# Altium schematic symbol library MCU_Microchip_ATmega.SchLib: 440 symbols (part 1 of 9) (continued)
## ATmega32A-M (continued)

## ATmega32A-P
designator *  value ATmega32A-P
ki_keywords: AVR 8bit Microcontroller MegaAVR; ki_description: 16MHz, 32kB Flash, 2kB SRAM, 1kB EEPROM, JTAG, DIP-40; ki_fp_filters: DIP*W15.24mm*; Footprint: Package_DIP:DIP-40_W15.24mm; Supplier: http://ww1.microchip.com/downloads/en/DeviceDoc/atmel-8155-8-bit-microcontroller-avr-atmega32a_datasheet.pdf
footprint DIP-40_W15.24mm
pins: 1 PB0 (io), 2 PB1 (io), 3 PB2 (io), 4 PB3 (io), 5 PB4 (io), 6 PB5 (io), 7 PB6 (io), 8 PB7 (io), 9 ~{{RESET}} (in), 10 VCC (power), 11 GND (power), 12 XTAL2 (out), 13 XTAL1 (in), 14 PD0 (io), 15 PD1 (io), 16 PD2 (io), 17 PD3 (io), 18 PD4 (io), 19 PD5 (io), 20 PD6 (io), 21 PD7 (io), 22 PC0 (io), 23 PC1 (io), 24 PC2 (io), 25 PC3 (io), 26 PC4 (io), 27 PC5 (io), 28 PC6 (io), 29 PC7 (io), 30 AVCC (power), 31 GND hidden, 32 AREF, 33 PA7 (io), 34 PA6 (io), 35 PA5 (io), 36 PA4 (io), 37 PA3 (io), 38 PA2 (io), 39 PA1 (io), 40 PA0 (io)

## ATmega32L-8A
designator *  value ATmega32L-8A
ki_keywords: AVR 8bit Microcontroller MegaAVR; ki_description: 8MHz, 32kB Flash, 2kB SRAM, 1kB EEPROM, JTAG, TQFP-44; ki_fp_filters: TQFP*10x10mm*P0.8mm*; Footprint: Package_QFP:TQFP-44_10x10mm_P0.8mm; Supplier: http://ww1.microchip.com/downloads/en/DeviceDoc/doc2503.pdf
footprint TQFP-44_10x10mm_P0.8mm
pins: 1 PB5 (io), 2 PB6 (io), 3 PB7 (io), 4 ~{{RESET}} (in), 5 VCC (power), 6 GND (power), 7 XTAL2 (out), 8 XTAL1 (in), 9 PD0 (io), 10 PD1 (io), 11 PD2 (io), 12 PD3 (io), 13 PD4 (io), 14 PD5 (io), 15 PD6 (io), 16 PD7 (io), 17 VCC hidden, 18 GND hidden, 19 PC0 (io), 20 PC1 (io), 21 PC2 (io), 22 PC3 (io), 23 PC4 (io), 24 PC5 (io), 25 PC6 (io), 26 PC7 (io), 27 AVCC (power), 28 GND hidden, 29 AREF, 30 PA7 (io), 31 PA6 (io), 32 PA5 (io), 33 PA4 (io), 34 PA3 (io), 35 PA2 (io), 36 PA1 (io), 37 PA0 (io), 38 VCC hidden, 39 GND hidden, 40 PB0 (io), 41 PB1 (io), 42 PB2 (io), 43 PB3 (io), 44 PB4 (io)

## ATmega32L-8M
designator *  value ATmega32L-8M
ki_keywords: AVR 8bit Microcontroller MegaAVR; ki_description: 8MHz, 32kB Flash, 2kB SRAM, 1kB EEPROM, JTAG, QFN-44; ki_fp_filters: QFN*1EP*7x7mm*P0.5mm*; Footprint: Package_DFN_QFN:QFN-44-1EP_7x7mm_P0.5mm_EP5.2x5.2mm; Supplier: http://ww1.microchip.com/downloads/en/DeviceDoc/doc2503.pdf
footprint QFN-44-1EP_7x7mm_P0.5mm_EP5.2x5.2mm
pins: 1 PB5 (io), 2 PB6 (io), 3 PB7 (io), 4 ~{{RESET}} (in), 5 VCC (power), 6 GND (power), 7 XTAL2 (out), 8 XTAL1 (in), 9 PD0 (io), 10 PD1 (io), 11 PD2 (io), 12 PD3 (io), 13 PD4 (io), 14 PD5 (io), 15 PD6 (io), 16 PD7 (io), 17 VCC hidden, 18 GND hidden, 19 PC0 (io), 20 PC1 (io), 21 PC2 (io), 22 PC3 (io), 23 PC4 (io), 24 PC5 (io), 25 PC6 (io), 26 PC7 (io), 27 AVCC (power), 28 GND hidden, 29 AREF, 30 PA7 (io), 31 PA6 (io), 32 PA5 (io), 33 PA4 (io), 34 PA3 (io), 35 PA2 (io), 36 PA1 (io), 37 PA0 (io), 38 VCC hidden, 39 GND hidden, 40 PB0 (io), 41 PB1 (io), 42 PB2 (io), 43 PB3 (io), 44 PB4 (io), 45 GND hidden

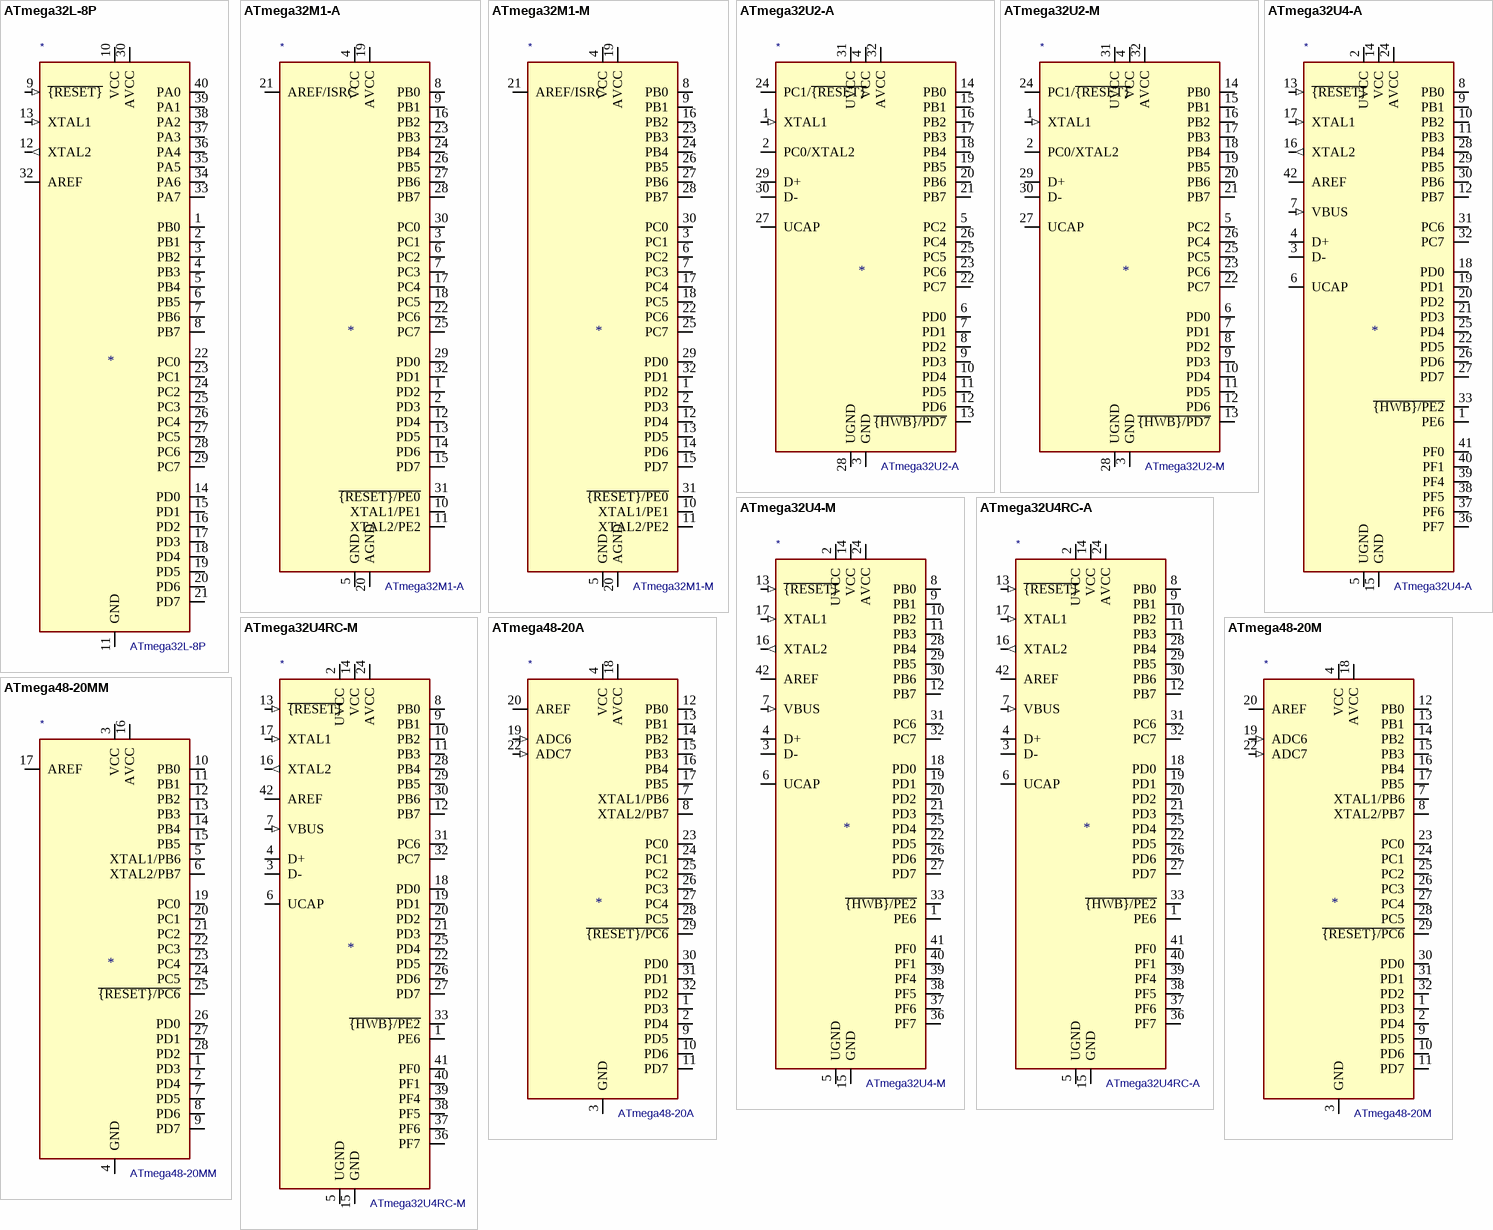
[diagram p3: symbols ATmega32L-8P to ATmega48-20MM]

## ATmega32L-8P
designator *  value ATmega32L-8P
ki_keywords: AVR 8bit Microcontroller MegaAVR; ki_description: 8MHz, 32kB Flash, 2kB SRAM, 1kB EEPROM, JTAG, DIP-40; ki_fp_filters: DIP*W15.24mm*; Footprint: Package_DIP:DIP-40_W15.24mm; Supplier: http://ww1.microchip.com/downloads/en/DeviceDoc/doc2503.pdf
footprint DIP-40_W15.24mm
pins: 1 PB0 (io), 2 PB1 (io), 3 PB2 (io), 4 PB3 (io), 5 PB4 (io), 6 PB5 (io), 7 PB6 (io), 8 PB7 (io), 9 ~{{RESET}} (in), 10 VCC (power), 11 GND (power), 12 XTAL2 (out), 13 XTAL1 (in), 14 PD0 (io), 15 PD1 (io), 16 PD2 (io), 17 PD3 (io), 18 PD4 (io), 19 PD5 (io), 20 PD6 (io), 21 PD7 (io), 22 PC0 (io), 23 PC1 (io), 24 PC2 (io), 25 PC3 (io), 26 PC4 (io), 27 PC5 (io), 28 PC6 (io), 29 PC7 (io), 30 AVCC (power), 31 GND hidden, 32 AREF, 33 PA7 (io), 34 PA6 (io), 35 PA5 (io), 36 PA4 (io), 37 PA3 (io), 38 PA2 (io), 39 PA1 (io), 40 PA0 (io)

## ATmega32M1-A
designator *  value ATmega32M1-A
ki_keywords: AVR 8bit Microcontroller MegaAVR; ki_description: 16MHz, 32kB Flash, 2kB SRAM, 1kB EEPROM, CAN, TQFP-32; ki_fp_filters: TQFP*7x7mm*P0.8mm*; Footprint: Package_QFP:TQFP-32_7x7mm_P0.8mm; Supplier: http://ww1.microchip.com/downloads/en/DeviceDoc/Atmel-8209-8-bit%20AVR%20ATmega16M1-32M1-64M1_Datasheet.pdf
footprint TQFP-32_7x7mm_P0.8mm
pins: 1 PD2 (io), 2 PD3 (io), 3 PC1 (io), 4 VCC (power), 5 GND (power), 6 PC2 (io), 7 PC3 (io), 8 PB0 (io), 9 PB1 (io), 10 XTAL1/PE1 (io), 11 XTAL2/PE2 (io), 12 PD4 (io), 13 PD5 (io), 14 PD6 (io), 15 PD7 (io), 16 PB2 (io), 17 PC4 (io), 18 PC5 (io), 19 AVCC (power), 20 AGND (power), 21 AREF/ISRC, 22 PC6 (io), 23 PB3 (io), 24 PB4 (io), 25 PC7 (io), 26 PB5 (io), 27 PB6 (io), 28 PB7 (io), 29 PD0 (io), 30 PC0 (io), 31 ~{{RESET}/PE0} (io), 32 PD1 (io)

## ATmega32M1-M
designator *  value ATmega32M1-M
ki_keywords: AVR 8bit Microcontroller MegaAVR; ki_description: 16MHz, 32kB Flash, 2kB SRAM, 1kB EEPROM, CAN, QFN-32; ki_fp_filters: QFN*1EP*7x7mm*P0.65mm*; Footprint: Package_DFN_QFN:QFN-32-1EP_7x7mm_P0.65mm_EP4.65x4.65mm; Supplier: http://ww1.microchip.com/downloads/en/DeviceDoc/Atmel-8209-8-bit%20AVR%20ATmega16M1-32M1-64M1_Datasheet.pdf
footprint QFN-32-1EP_7x7mm_P0.65mm_EP4.65x4.65mm
pins: 1 PD2 (io), 2 PD3 (io), 3 PC1 (io), 4 VCC (power), 5 GND (power), 6 PC2 (io), 7 PC3 (io), 8 PB0 (io), 9 PB1 (io), 10 XTAL1/PE1 (io), 11 XTAL2/PE2 (io), 12 PD4 (io), 13 PD5 (io), 14 PD6 (io), 15 PD7 (io), 16 PB2 (io), 17 PC4 (io), 18 PC5 (io), 19 AVCC (power), 20 AGND (power), 21 AREF/ISRC, 22 PC6 (io), 23 PB3 (io), 24 PB4 (io), 25 PC7 (io), 26 PB5 (io), 27 PB6 (io), 28 PB7 (io), 29 PD0 (io), 30 PC0 (io), 31 ~{{RESET}/PE0} (io), 32 PD1 (io), 33 GND hidden

## ATmega32U2-A
designator *  value ATmega32U2-A
ki_keywords: AVR 8bit Microcontroller MegaAVR; ki_description: 16MHz, 32kB Flash, 1kB SRAM, 1kB EEPROM, TQFP-32; ki_fp_filters: TQFP*7x7mm*P0.8mm*; Footprint: Package_QFP:TQFP-32_7x7mm_P0.8mm; Supplier: http://ww1.microchip.com/downloads/en/DeviceDoc/doc7799.pdf
footprint TQFP-32_7x7mm_P0.8mm
pins: 1 XTAL1 (in), 2 PC0/XTAL2 (io), 3 GND (power), 4 VCC (power), 5 PC2 (io), 6 PD0 (io), 7 PD1 (io), 8 PD2 (io), 9 PD3 (io), 10 PD4 (io), 11 PD5 (io), 12 PD6 (io), 13 ~{{HWB}/PD7} (io), 14 PB0 (io), 15 PB1 (io), 16 PB2 (io), 17 PB3 (io), 18 PB4 (io), 19 PB5 (io), 20 PB6 (io), 21 PB7 (io), 22 PC7 (io), 23 PC6 (io), 24 PC1/~{{RESET}} (io), 25 PC5 (io), 26 PC4 (io), 27 UCAP, 28 UGND (power), 29 D+ (io), 30 D- (io), 31 UVCC (power), 32 AVCC (power)

## ATmega32U2-M
designator *  value ATmega32U2-M
ki_keywords: AVR 8bit Microcontroller MegaAVR; ki_description: 16MHz, 32kB Flash, 1kB SRAM, 1kB EEPROM, QFN-32; ki_fp_filters: QFN*1EP*5x5mm*P0.5mm*; Footprint: Package_DFN_QFN:QFN-32-1EP_5x5mm_P0.5mm_EP3.1x3.1mm; Supplier: http://ww1.microchip.com/downloads/en/DeviceDoc/doc7799.pdf
footprint QFN-32-1EP_5x5mm_P0.5mm_EP3.1x3.1mm
pins: 1 XTAL1 (in), 2 PC0/XTAL2 (io), 3 GND (power), 4 VCC (power), 5 PC2 (io), 6 PD0 (io), 7 PD1 (io), 8 PD2 (io), 9 PD3 (io), 10 PD4 (io), 11 PD5 (io), 12 PD6 (io), 13 ~{{HWB}/PD7} (io), 14 PB0 (io), 15 PB1 (io), 16 PB2 (io), 17 PB3 (io), 18 PB4 (io), 19 PB5 (io), 20 PB6 (io), 21 PB7 (io), 22 PC7 (io), 23 PC6 (io), 24 PC1/~{{RESET}} (io), 25 PC5 (io), 26 PC4 (io), 27 UCAP, 28 UGND (power), 29 D+ (io), 30 D- (io), 31 UVCC (power), 32 AVCC (power), 33 GND hidden

## ATmega32U4-A
designator *  value ATmega32U4-A
ki_keywords: AVR 8bit Microcontroller MegaAVR USB; ki_description: 16MHz, 32kB Flash, 2.5kB SRAM, 1kB EEPROM, USB 2.0, TQFP-44; ki_fp_filters: TQFP*10x10mm*P0.8mm*; Footprint: Package_QFP:TQFP-44_10x10mm_P0.8mm; Supplier: http://ww1.microchip.com/downloads/en/DeviceDoc/Atmel-7766-8-bit-AVR-ATmega16U4-32U4_Datasheet.pdf
footprint TQFP-44_10x10mm_P0.8mm
pins: 1 PE6 (io), 2 UVCC (power), 3 D- (io), 4 D+ (io), 5 UGND, 6 UCAP, 7 VBUS (in), 8 PB0 (io), 9 PB1 (io), 10 PB2 (io), 11 PB3 (io), 12 PB7 (io), 13 ~{{RESET}} (in), 14 VCC (power), 15 GND (power), 16 XTAL2 (out), 17 XTAL1 (in), 18 PD0 (io), 19 PD1 (io), 20 PD2 (io), 21 PD3 (io), 22 PD5 (io), 23 GND hidden, 24 AVCC (power), 25 PD4 (io), 26 PD6 (io), 27 PD7 (io), 28 PB4 (io), 29 PB5 (io), 30 PB6 (io), 31 PC6 (io), 32 PC7 (io), 33 ~{{HWB}/PE2} (io), 34 VCC hidden, 35 GND hidden, 36 PF7 (io), 37 PF6 (io), 38 PF5 (io), 39 PF4 (io), 40 PF1 (io), 41 PF0 (io), 42 AREF, 43 GND hidden, 44 AVCC hidden

## ATmega32U4-M
designator *  value ATmega32U4-M
ki_keywords: AVR 8bit Microcontroller MegaAVR USB; ki_description: 16MHz, 32kB Flash, 2.5kB SRAM, 1kB EEPROM, USB 2.0, QFN-44; ki_fp_filters: QFN*1EP*7x7mm*P0.5mm*; Footprint: Package_DFN_QFN:QFN-44-1EP_7x7mm_P0.5mm_EP5.2x5.2mm; Supplier: http://ww1.microchip.com/downloads/en/DeviceDoc/Atmel-7766-8-bit-AVR-ATmega16U4-32U4_Datasheet.pdf
footprint QFN-44-1EP_7x7mm_P0.5mm_EP5.2x5.2mm
pins: 1 PE6 (io), 2 UVCC (power), 3 D- (io), 4 D+ (io), 5 UGND, 6 UCAP, 7 VBUS (in), 8 PB0 (io), 9 PB1 (io), 10 PB2 (io), 11 PB3 (io), 12 PB7 (io), 13 ~{{RESET}} (in), 14 VCC (power), 15 GND (power), 16 XTAL2 (out), 17 XTAL1 (in), 18 PD0 (io), 19 PD1 (io), 20 PD2 (io), 21 PD3 (io), 22 PD5 (io), 23 GND hidden, 24 AVCC (power), 25 PD4 (io), 26 PD6 (io), 27 PD7 (io), 28 PB4 (io), 29 PB5 (io), 30 PB6 (io), 31 PC6 (io), 32 PC7 (io), 33 ~{{HWB}/PE2} (io), 34 VCC hidden, 35 GND hidden, 36 PF7 (io), 37 PF6 (io), 38 PF5 (io), 39 PF4 (io), 40 PF1 (io), 41 PF0 (io), 42 AREF, 43 GND hidden, 44 AVCC hidden, 45 GND hidden

## ATmega32U4RC-A
designator *  value ATmega32U4RC-A
ki_keywords: AVR 8bit Microcontroller MegaAVR USB; ki_description: 16MHz, 32kB Flash, 2.5kB SRAM, 1kB EEPROM, USB 2.0, RC Osc, TQFP-44; ki_fp_filters: TQFP*10x10mm*P0.8mm*; Footprint: Package_QFP:TQFP-44_10x10mm_P0.8mm; Supplier: http://ww1.microchip.com/downloads/en/DeviceDoc/Atmel-7766-8-bit-AVR-ATmega16U4-32U4_Datasheet.pdf
footprint TQFP-44_10x10mm_P0.8mm
pins: 1 PE6 (io), 2 UVCC (power), 3 D- (io), 4 D+ (io), 5 UGND, 6 UCAP, 7 VBUS (in), 8 PB0 (io), 9 PB1 (io), 10 PB2 (io), 11 PB3 (io), 12 PB7 (io), 13 ~{{RESET}} (in), 14 VCC (power), 15 GND (power), 16 XTAL2 (out), 17 XTAL1 (in), 18 PD0 (io), 19 PD1 (io), 20 PD2 (io), 21 PD3 (io), 22 PD5 (io), 23 GND hidden, 24 AVCC (power), 25 PD4 (io), 26 PD6 (io), 27 PD7 (io), 28 PB4 (io), 29 PB5 (io), 30 PB6 (io), 31 PC6 (io), 32 PC7 (io), 33 ~{{HWB}/PE2} (io), 34 VCC hidden, 35 GND hidden, 36 PF7 (io), 37 PF6 (io), 38 PF5 (io), 39 PF4 (io), 40 PF1 (io), 41 PF0 (io), 42 AREF, 43 GND hidden, 44 AVCC hidden

## ATmega32U4RC-M
designator *  value ATmega32U4RC-M
ki_keywords: AVR 8bit Microcontroller MegaAVR USB; ki_description: 16MHz, 32kB Flash, 2.5kB SRAM, 1kB EEPROM, USB 2.0, RC Osc, QFN-44; ki_fp_filters: QFN*1EP*7x7mm*P0.5mm*; Footprint: Package_DFN_QFN:QFN-44-1EP_7x7mm_P0.5mm_EP5.2x5.2mm; Supplier: http://ww1.microchip.com/downloads/en/DeviceDoc/Atmel-7766-8-bit-AVR-ATmega16U4-32U4_Datasheet.pdf
footprint QFN-44-1EP_7x7mm_P0.5mm_EP5.2x5.2mm
pins: 1 PE6 (io), 2 UVCC (power), 3 D- (io), 4 D+ (io), 5 UGND, 6 UCAP, 7 VBUS (in), 8 PB0 (io), 9 PB1 (io), 10 PB2 (io), 11 PB3 (io), 12 PB7 (io), 13 ~{{RESET}} (in), 14 VCC (power), 15 GND (power), 16 XTAL2 (out), 17 XTAL1 (in), 18 PD0 (io), 19 PD1 (io), 20 PD2 (io), 21 PD3 (io), 22 PD5 (io), 23 GND hidden, 24 AVCC (power), 25 PD4 (io), 26 PD6 (io), 27 PD7 (io), 28 PB4 (io), 29 PB5 (io), 30 PB6 (io), 31 PC6 (io), 32 PC7 (io), 33 ~{{HWB}/PE2} (io), 34 VCC hidden, 35 GND hidden, 36 PF7 (io), 37 PF6 (io), 38 PF5 (io), 39 PF4 (io), 40 PF1 (io), 41 PF0 (io), 42 AREF, 43 GND hidden, 44 AVCC hidden, 45 GND hidden

## ATmega48-20A
designator *  value ATmega48-20A
ki_keywords: AVR 8bit Microcontroller MegaAVR; ki_description: 20MHz, 4kB Flash, 512B SRAM, 256B EEPROM, TQFP-32; ki_fp_filters: TQFP*7x7mm*P0.8mm*; Footprint: Package_QFP:TQFP-32_7x7mm_P0.8mm; Supplier: http://ww1.microchip.com/downloads/en/DeviceDoc/Atmel-2545-8-bit-AVR-Microcontroller-ATmega48-88-168_Datasheet.pdf
footprint TQFP-32_7x7mm_P0.8mm
pins: 1 PD3 (io), 2 PD4 (io), 3 GND (power), 4 VCC (power), 5 GND hidden, 6 VCC hidden, 7 XTAL1/PB6 (io), 8 XTAL2/PB7 (io), 9 PD5 (io), 10 PD6 (io), 11 PD7 (io), 12 PB0 (io), 13 PB1 (io), 14 PB2 (io), 15 PB3 (io), 16 PB4 (io), 17 PB5 (io), 18 AVCC (power), 19 ADC6 (in), 20 AREF, 21 GND hidden, 22 ADC7 (in), 23 PC0 (io), 24 PC1 (io), 25 PC2 (io), 26 PC3 (io), 27 PC4 (io), 28 PC5 (io), 29 ~{{RESET}/PC6} (io), 30 PD0 (io), 31 PD1 (io), 32 PD2 (io)

## ATmega48-20M
designator *  value ATmega48-20M
ki_keywords: AVR 8bit Microcontroller MegaAVR; ki_description: 20MHz, 4kB Flash, 512B SRAM, 256B EEPROM, QFN-32; ki_fp_filters: QFN*1EP*5x5mm*P0.5mm*; Footprint: Package_DFN_QFN:QFN-32-1EP_5x5mm_P0.5mm_EP3.1x3.1mm; Supplier: http://ww1.microchip.com/downloads/en/DeviceDoc/Atmel-2545-8-bit-AVR-Microcontroller-ATmega48-88-168_Datasheet.pdf
footprint QFN-32-1EP_5x5mm_P0.5mm_EP3.1x3.1mm
pins: 1 PD3 (io), 2 PD4 (io), 3 GND (power), 4 VCC (power), 5 GND hidden, 6 VCC hidden, 7 XTAL1/PB6 (io), 8 XTAL2/PB7 (io), 9 PD5 (io), 10 PD6 (io), 11 PD7 (io), 12 PB0 (io), 13 PB1 (io), 14 PB2 (io), 15 PB3 (io), 16 PB4 (io), 17 PB5 (io), 18 AVCC (power), 19 ADC6 (in), 20 AREF, 21 GND hidden, 22 ADC7 (in), 23 PC0 (io), 24 PC1 (io), 25 PC2 (io), 26 PC3 (io), 27 PC4 (io), 28 PC5 (io), 29 ~{{RESET}/PC6} (io), 30 PD0 (io), 31 PD1 (io), 32 PD2 (io), 33 GND hidden

## ATmega48-20MM
designator *  value ATmega48-20MM
ki_keywords: AVR 8bit Microcontroller MegaAVR; ki_description: 20MHz, 4kB Flash, 512B SRAM, 256B EEPROM, QFN-28; ki_fp_filters: QFN*1EP*4x4mm*P0.45mm*; Footprint: Package_DFN_QFN:QFN-28-1EP_4x4mm_P0.45mm_EP2.4x2.4mm; Supplier: http://ww1.microchip.com/downloads/en/DeviceDoc/Atmel-2545-8-bit-AVR-Microcontroller-ATmega48-88-168_Datasheet.pdf
footprint QFN-28-1EP_4x4mm_P0.45mm_EP2.4x2.4mm
pins: 1 PD3 (io), 2 PD4 (io), 3 VCC (power), 4 GND (power), 5 XTAL1/PB6 (io), 6 XTAL2/PB7 (io), 7 PD5 (io), 8 PD6 (io), 9 PD7 (io), 10 PB0 (io), 11 PB1 (io), 12 PB2 (io), 13 PB3 (io), 14 PB4 (io), 15 PB5 (io), 16 AVCC (power), 17 AREF, 18 GND hidden, 19 PC0 (io), 20 PC1 (io), 21 PC2 (io), 22 PC3 (io), 23 PC4 (io), 24 PC5 (io), 25 ~{{RESET}/PC6} (io), 26 PD0 (io), 27 PD1 (io), 28 PD2 (io), 29 GND hidden

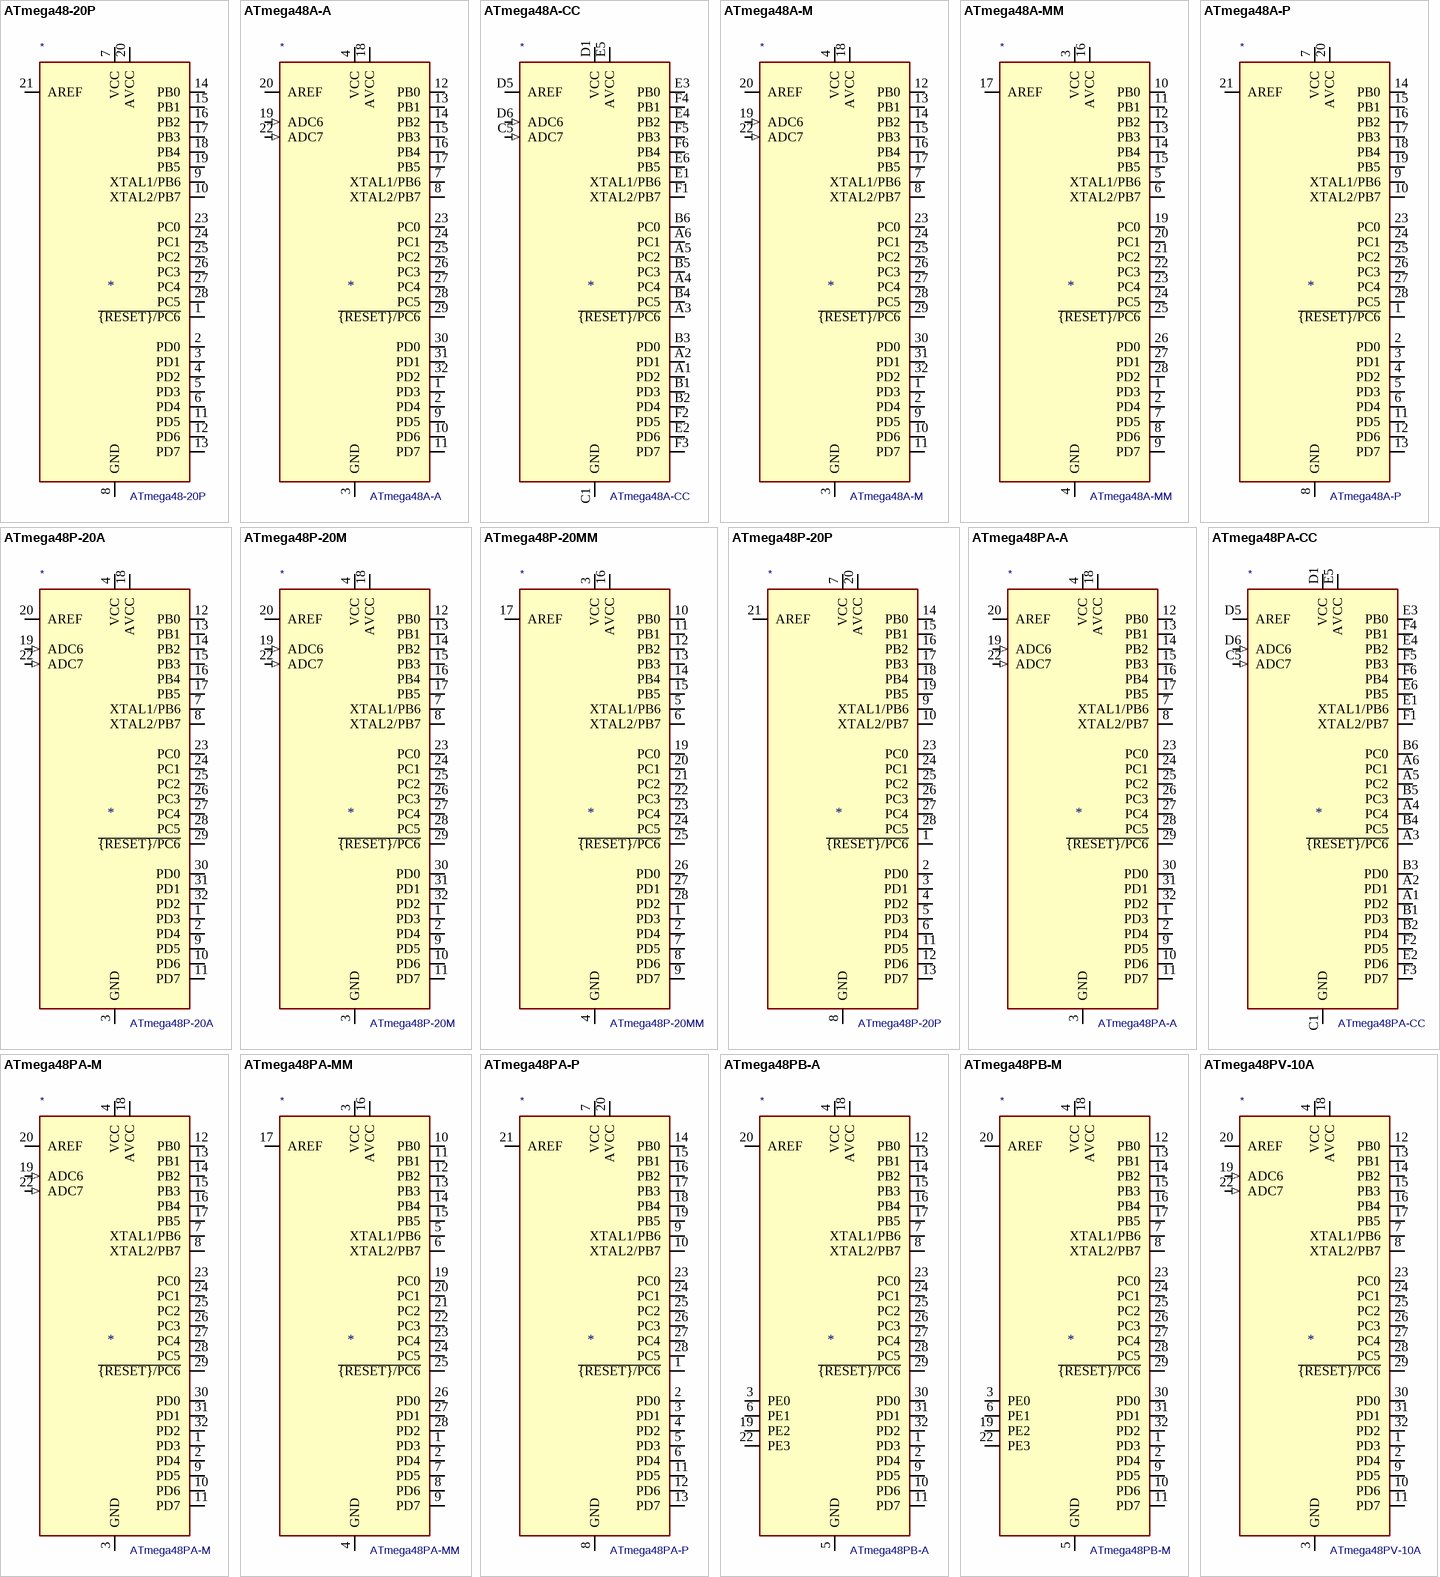
[diagram p4: symbols ATmega48-20P to ATmega48PV-10A]

## ATmega48-20P
designator *  value ATmega48-20P
ki_keywords: AVR 8bit Microcontroller MegaAVR; ki_description: 20MHz, 4kB Flash, 512B SRAM, 256B EEPROM, DIP-28; ki_fp_filters: DIP*W7.62mm*; Footprint: Package_DIP:DIP-28_W7.62mm; Supplier: http://ww1.microchip.com/downloads/en/DeviceDoc/Atmel-2545-8-bit-AVR-Microcontroller-ATmega48-88-168_Datasheet.pdf
footprint DIP-28_W7.62mm
pins: 1 ~{{RESET}/PC6} (io), 2 PD0 (io), 3 PD1 (io), 4 PD2 (io), 5 PD3 (io), 6 PD4 (io), 7 VCC (power), 8 GND (power), 9 XTAL1/PB6 (io), 10 XTAL2/PB7 (io), 11 PD5 (io), 12 PD6 (io), 13 PD7 (io), 14 PB0 (io), 15 PB1 (io), 16 PB2 (io), 17 PB3 (io), 18 PB4 (io), 19 PB5 (io), 20 AVCC (power), 21 AREF, 22 GND hidden, 23 PC0 (io), 24 PC1 (io), 25 PC2 (io), 26 PC3 (io), 27 PC4 (io), 28 PC5 (io)

## ATmega48A-A
designator *  value ATmega48A-A
ki_keywords: AVR 8bit Microcontroller MegaAVR; ki_description: 20MHz, 4kB Flash, 512B SRAM, 256B EEPROM, TQFP-32; ki_fp_filters: TQFP*7x7mm*P0.8mm*; Footprint: Package_QFP:TQFP-32_7x7mm_P0.8mm; Supplier: http://ww1.microchip.com/downloads/en/DeviceDoc/ATmega48A_88A_168A-Data-Sheet-40002007A.pdf
footprint TQFP-32_7x7mm_P0.8mm
pins: 1 PD3 (io), 2 PD4 (io), 3 GND (power), 4 VCC (power), 5 GND hidden, 6 VCC hidden, 7 XTAL1/PB6 (io), 8 XTAL2/PB7 (io), 9 PD5 (io), 10 PD6 (io), 11 PD7 (io), 12 PB0 (io), 13 PB1 (io), 14 PB2 (io), 15 PB3 (io), 16 PB4 (io), 17 PB5 (io), 18 AVCC (power), 19 ADC6 (in), 20 AREF, 21 GND hidden, 22 ADC7 (in), 23 PC0 (io), 24 PC1 (io), 25 PC2 (io), 26 PC3 (io), 27 PC4 (io), 28 PC5 (io), 29 ~{{RESET}/PC6} (io), 30 PD0 (io), 31 PD1 (io), 32 PD2 (io)

## ATmega48A-CC
designator *  value ATmega48A-CC
ki_keywords: AVR 8bit Microcontroller MegaAVR; ki_description: 20MHz, 4kB Flash, 512B SRAM, 256B EEPROM, UFBGA-32; ki_fp_filters: UFBGA*4.0x4.0mm*Layout6x6*P0.5mm*; Footprint: Package_BGA:UFBGA-32_4.0x4.0mm_Layout6x6_P0.5mm; Supplier: http://ww1.microchip.com/downloads/en/DeviceDoc/ATmega48A_88A_168A-Data-Sheet-40002007A.pdf
footprint UFBGA-32_4.0x4.0mm_Layout6x6_P0.5mm
pins: A1 PD2 (io), A2 PD1 (io), A3 ~{{RESET}/PC6} (io), A4 PC4 (io), A5 PC2 (io), A6 PC1 (io), B1 PD3 (io), B2 PD4 (io), B3 PD0 (io), B4 PC5 (io), B5 PC3 (io), B6 PC0 (io), C1 GND (power), C2 GND hidden, C5 ADC7 (in), C6 GND hidden, D1 VCC (power), D2 VCC hidden, D5 AREF, D6 ADC6 (in), E1 XTAL1/PB6 (io), E2 PD6 (io), E3 PB0 (io), E4 PB2 (io), E5 AVCC (power), E6 PB5 (io), F1 XTAL2/PB7 (io), F2 PD5 (io), F3 PD7 (io), F4 PB1 (io), F5 PB3 (io), F6 PB4 (io)

## ATmega48A-M
designator *  value ATmega48A-M
ki_keywords: AVR 8bit Microcontroller MegaAVR; ki_description: 20MHz, 4kB Flash, 512B SRAM, 256B EEPROM, QFN-32; ki_fp_filters: QFN*1EP*5x5mm*P0.5mm*; Footprint: Package_DFN_QFN:QFN-32-1EP_5x5mm_P0.5mm_EP3.1x3.1mm; Supplier: http://ww1.microchip.com/downloads/en/DeviceDoc/ATmega48A_88A_168A-Data-Sheet-40002007A.pdf
footprint QFN-32-1EP_5x5mm_P0.5mm_EP3.1x3.1mm
pins: 1 PD3 (io), 2 PD4 (io), 3 GND (power), 4 VCC (power), 5 GND hidden, 6 VCC hidden, 7 XTAL1/PB6 (io), 8 XTAL2/PB7 (io), 9 PD5 (io), 10 PD6 (io), 11 PD7 (io), 12 PB0 (io), 13 PB1 (io), 14 PB2 (io), 15 PB3 (io), 16 PB4 (io), 17 PB5 (io), 18 AVCC (power), 19 ADC6 (in), 20 AREF, 21 GND hidden, 22 ADC7 (in), 23 PC0 (io), 24 PC1 (io), 25 PC2 (io), 26 PC3 (io), 27 PC4 (io), 28 PC5 (io), 29 ~{{RESET}/PC6} (io), 30 PD0 (io), 31 PD1 (io), 32 PD2 (io), 33 GND hidden

## ATmega48A-MM
designator *  value ATmega48A-MM
ki_keywords: AVR 8bit Microcontroller MegaAVR; ki_description: 20MHz, 4kB Flash, 512B SRAM, 256B EEPROM, QFN-28; ki_fp_filters: QFN*1EP*4x4mm*P0.45mm*; Footprint: Package_DFN_QFN:QFN-28-1EP_4x4mm_P0.45mm_EP2.4x2.4mm; Supplier: http://ww1.microchip.com/downloads/en/DeviceDoc/ATmega48A_88A_168A-Data-Sheet-40002007A.pdf
footprint QFN-28-1EP_4x4mm_P0.45mm_EP2.4x2.4mm
pins: 1 PD3 (io), 2 PD4 (io), 3 VCC (power), 4 GND (power), 5 XTAL1/PB6 (io), 6 XTAL2/PB7 (io), 7 PD5 (io), 8 PD6 (io), 9 PD7 (io), 10 PB0 (io), 11 PB1 (io), 12 PB2 (io), 13 PB3 (io), 14 PB4 (io), 15 PB5 (io), 16 AVCC (power), 17 AREF, 18 GND hidden, 19 PC0 (io), 20 PC1 (io), 21 PC2 (io), 22 PC3 (io), 23 PC4 (io), 24 PC5 (io), 25 ~{{RESET}/PC6} (io), 26 PD0 (io), 27 PD1 (io), 28 PD2 (io), 29 GND hidden

## ATmega48A-P
designator *  value ATmega48A-P
ki_keywords: AVR 8bit Microcontroller MegaAVR; ki_description: 20MHz, 4kB Flash, 512B SRAM, 256B EEPROM, DIP-28; ki_fp_filters: DIP*W7.62mm*; Footprint: Package_DIP:DIP-28_W7.62mm; Supplier: http://ww1.microchip.com/downloads/en/DeviceDoc/ATmega48A_88A_168A-Data-Sheet-40002007A.pdf
footprint DIP-28_W7.62mm
pins: 1 ~{{RESET}/PC6} (io), 2 PD0 (io), 3 PD1 (io), 4 PD2 (io), 5 PD3 (io), 6 PD4 (io), 7 VCC (power), 8 GND (power), 9 XTAL1/PB6 (io), 10 XTAL2/PB7 (io), 11 PD5 (io), 12 PD6 (io), 13 PD7 (io), 14 PB0 (io), 15 PB1 (io), 16 PB2 (io), 17 PB3 (io), 18 PB4 (io), 19 PB5 (io), 20 AVCC (power), 21 AREF, 22 GND hidden, 23 PC0 (io), 24 PC1 (io), 25 PC2 (io), 26 PC3 (io), 27 PC4 (io), 28 PC5 (io)

## ATmega48P-20A
designator *  value ATmega48P-20A
ki_keywords: AVR 8bit Microcontroller MegaAVR; ki_description: 20MHz, 4kB Flash, 512B SRAM, 256B EEPROM, TQFP-32; ki_fp_filters: TQFP*7x7mm*P0.8mm*; Footprint: Package_QFP:TQFP-32_7x7mm_P0.8mm; Supplier: http://ww1.microchip.com/downloads/en/DeviceDoc/Atmel-8025-8-bit-AVR-Microcontroller-ATmega48P-88P-168P_Datasheet.pdf
footprint TQFP-32_7x7mm_P0.8mm
pins: 1 PD3 (io), 2 PD4 (io), 3 GND (power), 4 VCC (power), 5 GND hidden, 6 VCC hidden, 7 XTAL1/PB6 (io), 8 XTAL2/PB7 (io), 9 PD5 (io), 10 PD6 (io), 11 PD7 (io), 12 PB0 (io), 13 PB1 (io), 14 PB2 (io), 15 PB3 (io), 16 PB4 (io), 17 PB5 (io), 18 AVCC (power), 19 ADC6 (in), 20 AREF, 21 GND hidden, 22 ADC7 (in), 23 PC0 (io), 24 PC1 (io), 25 PC2 (io), 26 PC3 (io), 27 PC4 (io), 28 PC5 (io), 29 ~{{RESET}/PC6} (io), 30 PD0 (io), 31 PD1 (io), 32 PD2 (io)

## ATmega48P-20M
designator *  value ATmega48P-20M
ki_keywords: AVR 8bit Microcontroller MegaAVR; ki_description: 20MHz, 4kB Flash, 512B SRAM, 256B EEPROM, QFN-32; ki_fp_filters: QFN*1EP*5x5mm*P0.5mm*; Footprint: Package_DFN_QFN:QFN-32-1EP_5x5mm_P0.5mm_EP3.1x3.1mm; Supplier: http://ww1.microchip.com/downloads/en/DeviceDoc/Atmel-8025-8-bit-AVR-Microcontroller-ATmega48P-88P-168P_Datasheet.pdf
footprint QFN-32-1EP_5x5mm_P0.5mm_EP3.1x3.1mm
pins: 1 PD3 (io), 2 PD4 (io), 3 GND (power), 4 VCC (power), 5 GND hidden, 6 VCC hidden, 7 XTAL1/PB6 (io), 8 XTAL2/PB7 (io), 9 PD5 (io), 10 PD6 (io), 11 PD7 (io), 12 PB0 (io), 13 PB1 (io), 14 PB2 (io), 15 PB3 (io), 16 PB4 (io), 17 PB5 (io), 18 AVCC (power), 19 ADC6 (in), 20 AREF, 21 GND hidden, 22 ADC7 (in), 23 PC0 (io), 24 PC1 (io), 25 PC2 (io), 26 PC3 (io), 27 PC4 (io), 28 PC5 (io), 29 ~{{RESET}/PC6} (io), 30 PD0 (io), 31 PD1 (io), 32 PD2 (io), 33 GND hidden

## ATmega48P-20MM
designator *  value ATmega48P-20MM
ki_keywords: AVR 8bit Microcontroller MegaAVR; ki_description: 20MHz, 4kB Flash, 512B SRAM, 256B EEPROM, QFN-28; ki_fp_filters: QFN*1EP*4x4mm*P0.45mm*; Footprint: Package_DFN_QFN:QFN-28-1EP_4x4mm_P0.45mm_EP2.4x2.4mm; Supplier: http://ww1.microchip.com/downloads/en/DeviceDoc/Atmel-8025-8-bit-AVR-Microcontroller-ATmega48P-88P-168P_Datasheet.pdf
footprint QFN-28-1EP_4x4mm_P0.45mm_EP2.4x2.4mm
pins: 1 PD3 (io), 2 PD4 (io), 3 VCC (power), 4 GND (power), 5 XTAL1/PB6 (io), 6 XTAL2/PB7 (io), 7 PD5 (io), 8 PD6 (io), 9 PD7 (io), 10 PB0 (io), 11 PB1 (io), 12 PB2 (io), 13 PB3 (io), 14 PB4 (io), 15 PB5 (io), 16 AVCC (power), 17 AREF, 18 GND hidden, 19 PC0 (io), 20 PC1 (io), 21 PC2 (io), 22 PC3 (io), 23 PC4 (io), 24 PC5 (io), 25 ~{{RESET}/PC6} (io), 26 PD0 (io), 27 PD1 (io), 28 PD2 (io), 29 GND hidden

## ATmega48P-20P
designator *  value ATmega48P-20P
ki_keywords: AVR 8bit Microcontroller MegaAVR; ki_description: 20MHz, 4kB Flash, 512B SRAM, 256B EEPROM, DIP-28; ki_fp_filters: DIP*W7.62mm*; Footprint: Package_DIP:DIP-28_W7.62mm; Supplier: http://ww1.microchip.com/downloads/en/DeviceDoc/Atmel-8025-8-bit-AVR-Microcontroller-ATmega48P-88P-168P_Datasheet.pdf
footprint DIP-28_W7.62mm
pins: 1 ~{{RESET}/PC6} (io), 2 PD0 (io), 3 PD1 (io), 4 PD2 (io), 5 PD3 (io), 6 PD4 (io), 7 VCC (power), 8 GND (power), 9 XTAL1/PB6 (io), 10 XTAL2/PB7 (io), 11 PD5 (io), 12 PD6 (io), 13 PD7 (io), 14 PB0 (io), 15 PB1 (io), 16 PB2 (io), 17 PB3 (io), 18 PB4 (io), 19 PB5 (io), 20 AVCC (power), 21 AREF, 22 GND hidden, 23 PC0 (io), 24 PC1 (io), 25 PC2 (io), 26 PC3 (io), 27 PC4 (io), 28 PC5 (io)

## ATmega48PA-A
designator *  value ATmega48PA-A
ki_keywords: AVR 8bit Microcontroller MegaAVR PicoPower; ki_description: 20MHz, 4kB Flash, 512B SRAM, 256B EEPROM, TQFP-32; ki_fp_filters: TQFP*7x7mm*P0.8mm*; Footprint: Package_QFP:TQFP-32_7x7mm_P0.8mm; Supplier: http://ww1.microchip.com/downloads/en/DeviceDoc/ATmega48PA_88PA_168PA-Data-Sheet-40002011A.pdf
footprint TQFP-32_7x7mm_P0.8mm
pins: 1 PD3 (io), 2 PD4 (io), 3 GND (power), 4 VCC (power), 5 GND hidden, 6 VCC hidden, 7 XTAL1/PB6 (io), 8 XTAL2/PB7 (io), 9 PD5 (io), 10 PD6 (io), 11 PD7 (io), 12 PB0 (io), 13 PB1 (io), 14 PB2 (io), 15 PB3 (io), 16 PB4 (io), 17 PB5 (io), 18 AVCC (power), 19 ADC6 (in), 20 AREF, 21 GND hidden, 22 ADC7 (in), 23 PC0 (io), 24 PC1 (io), 25 PC2 (io), 26 PC3 (io), 27 PC4 (io), 28 PC5 (io), 29 ~{{RESET}/PC6} (io), 30 PD0 (io), 31 PD1 (io), 32 PD2 (io)

## ATmega48PA-CC
designator *  value ATmega48PA-CC
ki_keywords: AVR 8bit Microcontroller MegaAVR PicoPower; ki_description: 20MHz, 4kB Flash, 512B SRAM, 256B EEPROM, UFBGA-32; ki_fp_filters: UFBGA*4.0x4.0mm*Layout6x6*P0.5mm*; Footprint: Package_BGA:UFBGA-32_4.0x4.0mm_Layout6x6_P0.5mm; Supplier: http://ww1.microchip.com/downloads/en/DeviceDoc/ATmega48PA_88PA_168PA-Data-Sheet-40002011A.pdf
footprint UFBGA-32_4.0x4.0mm_Layout6x6_P0.5mm
pins: A1 PD2 (io), A2 PD1 (io), A3 ~{{RESET}/PC6} (io), A4 PC4 (io), A5 PC2 (io), A6 PC1 (io), B1 PD3 (io), B2 PD4 (io), B3 PD0 (io), B4 PC5 (io), B5 PC3 (io), B6 PC0 (io), C1 GND (power), C2 GND hidden, C5 ADC7 (in), C6 GND hidden, D1 VCC (power), D2 VCC hidden, D5 AREF, D6 ADC6 (in), E1 XTAL1/PB6 (io), E2 PD6 (io), E3 PB0 (io), E4 PB2 (io), E5 AVCC (power), E6 PB5 (io), F1 XTAL2/PB7 (io), F2 PD5 (io), F3 PD7 (io), F4 PB1 (io), F5 PB3 (io), F6 PB4 (io)

## ATmega48PA-M
designator *  value ATmega48PA-M
ki_keywords: AVR 8bit Microcontroller MegaAVR PicoPower; ki_description: 20MHz, 4kB Flash, 512B SRAM, 256B EEPROM, QFN-32; ki_fp_filters: QFN*1EP*5x5mm*P0.5mm*; Footprint: Package_DFN_QFN:QFN-32-1EP_5x5mm_P0.5mm_EP3.1x3.1mm; Supplier: http://ww1.microchip.com/downloads/en/DeviceDoc/ATmega48PA_88PA_168PA-Data-Sheet-40002011A.pdf
footprint QFN-32-1EP_5x5mm_P0.5mm_EP3.1x3.1mm
pins: 1 PD3 (io), 2 PD4 (io), 3 GND (power), 4 VCC (power), 5 GND hidden, 6 VCC hidden, 7 XTAL1/PB6 (io), 8 XTAL2/PB7 (io), 9 PD5 (io), 10 PD6 (io), 11 PD7 (io), 12 PB0 (io), 13 PB1 (io), 14 PB2 (io), 15 PB3 (io), 16 PB4 (io), 17 PB5 (io), 18 AVCC (power), 19 ADC6 (in), 20 AREF, 21 GND hidden, 22 ADC7 (in), 23 PC0 (io), 24 PC1 (io), 25 PC2 (io), 26 PC3 (io), 27 PC4 (io), 28 PC5 (io), 29 ~{{RESET}/PC6} (io), 30 PD0 (io), 31 PD1 (io), 32 PD2 (io), 33 GND hidden

## ATmega48PA-MM
designator *  value ATmega48PA-MM
ki_keywords: AVR 8bit Microcontroller MegaAVR PicoPower; ki_description: 20MHz, 4kB Flash, 512B SRAM, 256B EEPROM, QFN-28; ki_fp_filters: QFN*1EP*4x4mm*P0.45mm*; Footprint: Package_DFN_QFN:QFN-28-1EP_4x4mm_P0.45mm_EP2.4x2.4mm; Supplier: http://ww1.microchip.com/downloads/en/DeviceDoc/ATmega48PA_88PA_168PA-Data-Sheet-40002011A.pdf
footprint QFN-28-1EP_4x4mm_P0.45mm_EP2.4x2.4mm
pins: 1 PD3 (io), 2 PD4 (io), 3 VCC (power), 4 GND (power), 5 XTAL1/PB6 (io), 6 XTAL2/PB7 (io), 7 PD5 (io), 8 PD6 (io), 9 PD7 (io), 10 PB0 (io), 11 PB1 (io), 12 PB2 (io), 13 PB3 (io), 14 PB4 (io), 15 PB5 (io), 16 AVCC (power), 17 AREF, 18 GND hidden, 19 PC0 (io), 20 PC1 (io), 21 PC2 (io), 22 PC3 (io), 23 PC4 (io), 24 PC5 (io), 25 ~{{RESET}/PC6} (io), 26 PD0 (io), 27 PD1 (io), 28 PD2 (io), 29 GND hidden

## ATmega48PA-P
designator *  value ATmega48PA-P
ki_keywords: AVR 8bit Microcontroller MegaAVR PicoPower; ki_description: 20MHz, 4kB Flash, 512B SRAM, 256B EEPROM, DIP-28; ki_fp_filters: DIP*W7.62mm*; Footprint: Package_DIP:DIP-28_W7.62mm; Supplier: http://ww1.microchip.com/downloads/en/DeviceDoc/ATmega48PA_88PA_168PA-Data-Sheet-40002011A.pdf
footprint DIP-28_W7.62mm
pins: 1 ~{{RESET}/PC6} (io), 2 PD0 (io), 3 PD1 (io), 4 PD2 (io), 5 PD3 (io), 6 PD4 (io), 7 VCC (power), 8 GND (power), 9 XTAL1/PB6 (io), 10 XTAL2/PB7 (io), 11 PD5 (io), 12 PD6 (io), 13 PD7 (io), 14 PB0 (io), 15 PB1 (io), 16 PB2 (io), 17 PB3 (io), 18 PB4 (io), 19 PB5 (io), 20 AVCC (power), 21 AREF, 22 GND hidden, 23 PC0 (io), 24 PC1 (io), 25 PC2 (io), 26 PC3 (io), 27 PC4 (io), 28 PC5 (io)

## ATmega48PB-A
designator *  value ATmega48PB-A
ki_keywords: AVR 8bit Microcontroller MegaAVR; ki_description: 20MHz, 4kB Flash, 512B SRAM, 256B EEPROM, TQFP-32; ki_fp_filters: TQFP*7x7mm*P0.8mm*; Footprint: Package_QFP:TQFP-32_7x7mm_P0.8mm; Supplier: http://ww1.microchip.com/downloads/en/DeviceDoc/40001909A.pdf
footprint TQFP-32_7x7mm_P0.8mm
pins: 1 PD3 (io), 2 PD4 (io), 3 PE0 (io), 4 VCC (power), 5 GND (power), 6 PE1 (io), 7 XTAL1/PB6 (io), 8 XTAL2/PB7 (io), 9 PD5 (io), 10 PD6 (io), 11 PD7 (io), 12 PB0 (io), 13 PB1 (io), 14 PB2 (io), 15 PB3 (io), 16 PB4 (io), 17 PB5 (io), 18 AVCC (power), 19 PE2 (io), 20 AREF, 21 GND hidden, 22 PE3 (io), 23 PC0 (io), 24 PC1 (io), 25 PC2 (io), 26 PC3 (io), 27 PC4 (io), 28 PC5 (io), 29 ~{{RESET}/PC6} (io), 30 PD0 (io), 31 PD1 (io), 32 PD2 (io)

## ATmega48PB-M
designator *  value ATmega48PB-M
ki_keywords: AVR 8bit Microcontroller MegaAVR; ki_description: 20MHz, 4kB Flash, 512B SRAM, 256B EEPROM, QFN-32; ki_fp_filters: QFN*1EP*5x5mm*P0.5mm*; Footprint: Package_DFN_QFN:QFN-32-1EP_5x5mm_P0.5mm_EP3.1x3.1mm; Supplier: http://ww1.microchip.com/downloads/en/DeviceDoc/40001909A.pdf
footprint QFN-32-1EP_5x5mm_P0.5mm_EP3.1x3.1mm
pins: 1 PD3 (io), 2 PD4 (io), 3 PE0 (io), 4 VCC (power), 5 GND (power), 6 PE1 (io), 7 XTAL1/PB6 (io), 8 XTAL2/PB7 (io), 9 PD5 (io), 10 PD6 (io), 11 PD7 (io), 12 PB0 (io), 13 PB1 (io), 14 PB2 (io), 15 PB3 (io), 16 PB4 (io), 17 PB5 (io), 18 AVCC (power), 19 PE2 (io), 20 AREF, 21 GND hidden, 22 PE3 (io), 23 PC0 (io), 24 PC1 (io), 25 PC2 (io), 26 PC3 (io), 27 PC4 (io), 28 PC5 (io), 29 ~{{RESET}/PC6} (io), 30 PD0 (io), 31 PD1 (io), 32 PD2 (io), 33 GND hidden

## ATmega48PV-10A
designator *  value ATmega48PV-10A
ki_keywords: AVR 8bit Microcontroller MegaAVR; ki_description: 10MHz, 4kB Flash, 512B SRAM, 256B EEPROM, TQFP-32; ki_fp_filters: TQFP*7x7mm*P0.8mm*; Footprint: Package_QFP:TQFP-32_7x7mm_P0.8mm; Supplier: http://ww1.microchip.com/downloads/en/DeviceDoc/Atmel-8025-8-bit-AVR-Microcontroller-ATmega48P-88P-168P_Datasheet.pdf
footprint TQFP-32_7x7mm_P0.8mm
pins: 1 PD3 (io), 2 PD4 (io), 3 GND (power), 4 VCC (power), 5 GND hidden, 6 VCC hidden, 7 XTAL1/PB6 (io), 8 XTAL2/PB7 (io), 9 PD5 (io), 10 PD6 (io), 11 PD7 (io), 12 PB0 (io), 13 PB1 (io), 14 PB2 (io), 15 PB3 (io), 16 PB4 (io), 17 PB5 (io), 18 AVCC (power), 19 ADC6 (in), 20 AREF, 21 GND hidden, 22 ADC7 (in), 23 PC0 (io), 24 PC1 (io), 25 PC2 (io), 26 PC3 (io), 27 PC4 (io), 28 PC5 (io), 29 ~{{RESET}/PC6} (io), 30 PD0 (io), 31 PD1 (io), 32 PD2 (io)

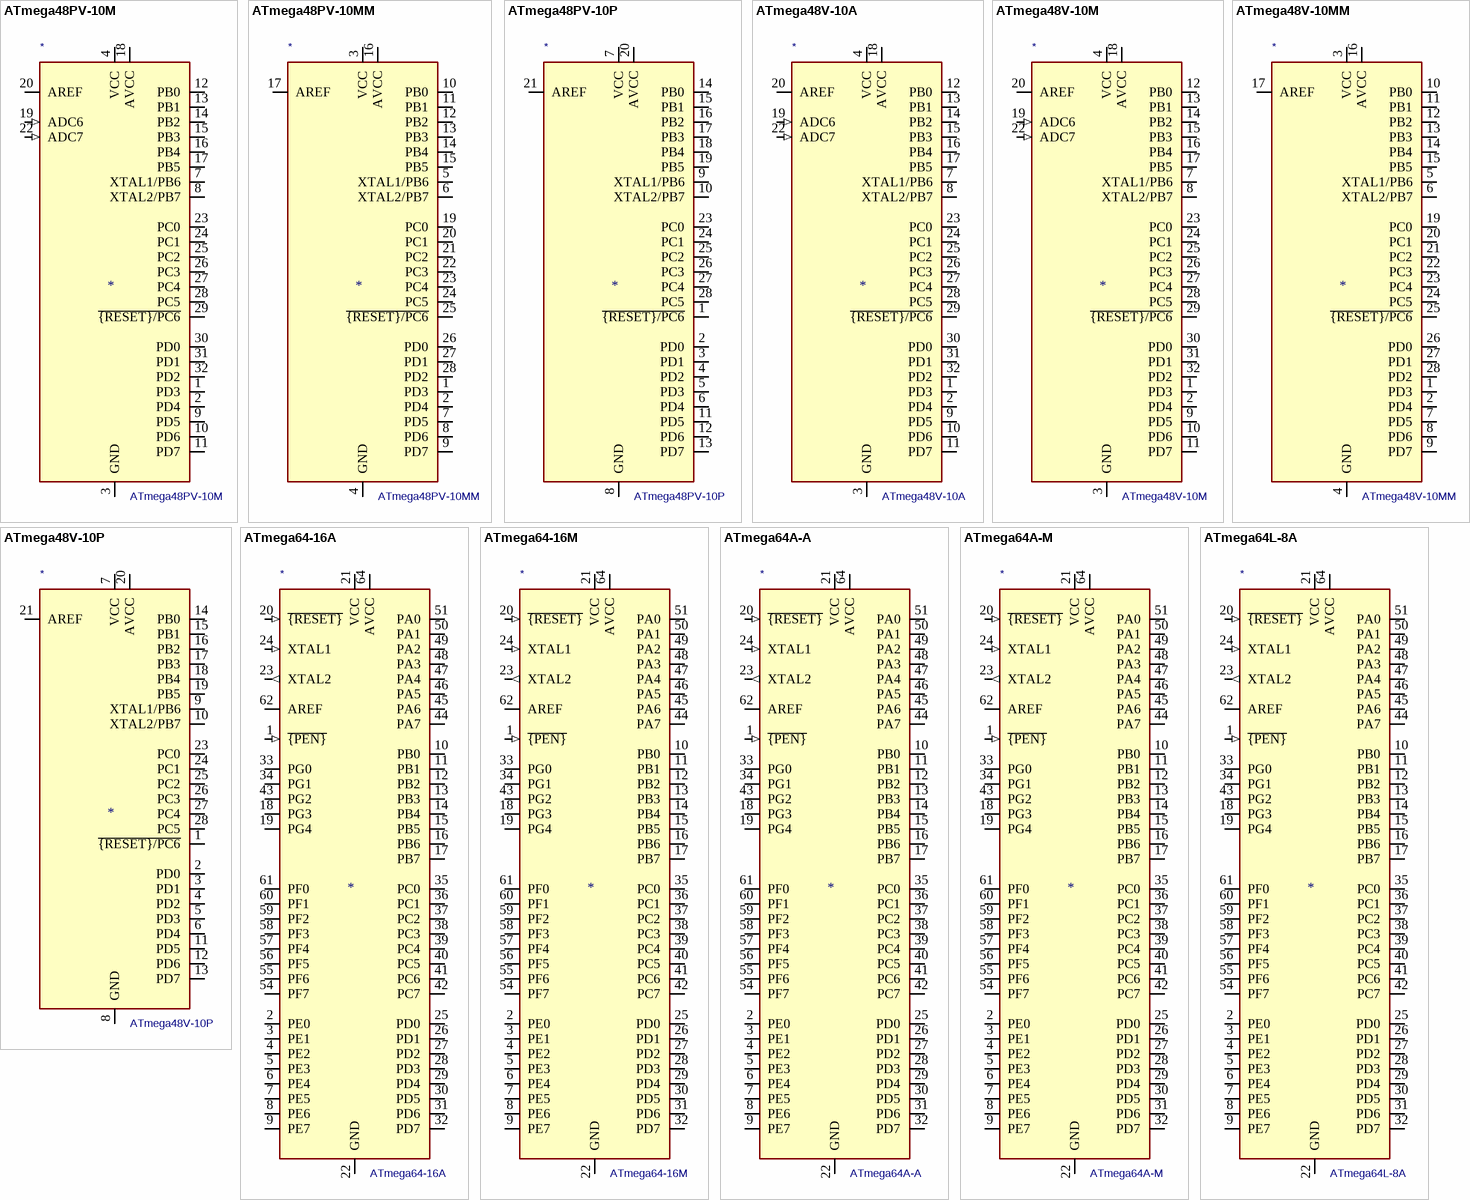
[diagram p5: symbols ATmega48PV-10M to ATmega64L-8A]

## ATmega48PV-10M
designator *  value ATmega48PV-10M
ki_keywords: AVR 8bit Microcontroller MegaAVR; ki_description: 10MHz, 4kB Flash, 512B SRAM, 256B EEPROM, QFN-32; ki_fp_filters: QFN*1EP*5x5mm*P0.5mm*; Footprint: Package_DFN_QFN:QFN-32-1EP_5x5mm_P0.5mm_EP3.1x3.1mm; Supplier: http://ww1.microchip.com/downloads/en/DeviceDoc/Atmel-8025-8-bit-AVR-Microcontroller-ATmega48P-88P-168P_Datasheet.pdf
footprint QFN-32-1EP_5x5mm_P0.5mm_EP3.1x3.1mm
pins: 1 PD3 (io), 2 PD4 (io), 3 GND (power), 4 VCC (power), 5 GND hidden, 6 VCC hidden, 7 XTAL1/PB6 (io), 8 XTAL2/PB7 (io), 9 PD5 (io), 10 PD6 (io), 11 PD7 (io), 12 PB0 (io), 13 PB1 (io), 14 PB2 (io), 15 PB3 (io), 16 PB4 (io), 17 PB5 (io), 18 AVCC (power), 19 ADC6 (in), 20 AREF, 21 GND hidden, 22 ADC7 (in), 23 PC0 (io), 24 PC1 (io), 25 PC2 (io), 26 PC3 (io), 27 PC4 (io), 28 PC5 (io), 29 ~{{RESET}/PC6} (io), 30 PD0 (io), 31 PD1 (io), 32 PD2 (io), 33 GND hidden